# Altium integrated library mylib.IntLib: 236 symbols (part 1 of 2) (continued)
## FPC-50P (continued)

## G2R-2
designator K?
pins: A1, A2, A3, B1, B2, B3, X1, X2
text: X

## G6H
designator U?
G6HK-2
pins: 1 + (in), 2 C, 3 P, 4 O, 5 - (out), 6 - (out), 7 O, 8 P, 9 C, 10 + (in)

## GB8XS
designator P?
footprint finger
pins: 1, 2, 3, 4, 5, 6, 7, 8

## GDS
designator G?  (value not drawn)
GAS DISCHARGE TUBE
footprint LC-GDTs_SMD
footprint LC-SMD-5050_2P
pins: 1, 2

## HAL13S
designator Q?, comment 013  (value not drawn)
footprint LC-SOT-23-3
pins: 1 VCC (power), 2 GND (power), 3 Q (power)

## HC165AG
designator U?
8-Bit Parallel-Load Shift Register; Published: 8-Jun-2000; LatestRevisionDate: 13-Apr-2006; LatestRevisionNote: IPC-7351 Footprint Added.; DatasheetVersion: May-1997; PackageVersion: Jan-1998; PackageReference: D016; Publisher: Altium Limited; PackageDescription: 16-Pin Small Outline Integrated Circuit 1.27 mm Pitch; Code_IPC: SOIC127P600-16; ComponentLink1Description: Manufacturer Link; ComponentLink1URL: http://www.ti.com/; ComponentLink2Description: Datasheet; ComponentLink2URL: http://www-s.ti.com/sc/ds/sn74hc165.pdf
footprint SOIC-16
pins: 1 SH/~{LD} (in), 2 CLK (in), 3 E (in), 4 F (in), 5 G (in), 6 H (in), 7 ~{QH} (out), 8 GND (power), 9 QH (out), 10 SI (in), 11 A (in), 12 B (in), 13 C (in), 14 D (in), 15 CLK INH (in), 16 VCC (power)

## HCNR200
designator U?  (value not drawn)
footprint LC-DIP-8_K
pins: 1 A "Anode", 2 K "Cathode", 3 E "Emitter", 4 C "Collector", 5 C "Collector", 6 PD2 "Collector", 7 NC "Collector", 8 NC "Collector"

## HEAD-10L
designator P?, comment SH230R-5.08  (value not drawn)
footprint HEAD-10L-2.0 (Connector; Header; 8 Position)
pins: 1, 2, 3, 4, 5, 6, 7, 8, 9, 10

## HEAD-10P
designator P?, comment SH230R-5.08  (value not drawn)
footprint HEAD-10P-2.0
pins: 1, 2, 3, 4, 5, 6, 7, 8, 9, 10

## HEAD-18L
designator P?, comment SH230R-5.08  (value not drawn)
footprint HEAD-18L-2.0 (Connector; Header; 8 Position)
pins: 1, 2, 3, 4, 5, 6, 7, 8, 9, 10, 11, 12, 13, 14, 15, 16, 17, 18

## HEAD-18P
designator P?, comment SH230R-5.08  (value not drawn)
footprint HEAD-18P-2.0
pins: 1, 2, 3, 4, 5, 6, 7, 8, 9, 10, 11, 12, 13, 14, 15, 16, 17, 18

## Header 2
designator P?
Header, 2-Pin; LatestRevisionDate: 17-Jul-2002; LatestRevisionNote: Re-released for DXP Platform.; Publisher: Altium Limited
footprint CJ
pins: 1, 2
2 alternate drawings of the same symbol

## HH52B
designator K?
footprint HH52B
pins: A1, A2, A3, B1, B2, B3, X1, X2
text: X

## HH53B
designator K?
footprint HH53B
pins: A1, A2, A3, B1, B2, B3, C1, C2, C3, X1, X2
4 alternate drawings of the same symbol
text: X

## HH54B
designator K?
footprint HH54B
pins: A1, A2, A3, B1, B2, B3, C1, C2, C3, D1, D2, D3, X1, X2
text: X

## HT48R06A-1
designator U?
footprint DIP18
pins: 1 PA3 (in), 2 PA2 (in), 3 PA1 (in), 4 PA0 (in), 5 PB2 (in), 6 PB1/~{BZ} (in), 7 PB0/BZ (in), 8 VSS (power), 9 PC0/~{INT} (in), 10 PC1/~{TMR} (in), 11 ~{RES} (in), 12 VDD (power), 13 OSC1 (in), 14 OSC2 (in), 15 PA7 (in), 16 PA6 (in), 17 PA5 (in), 18 PA4 (in)

## HT48X05
designator U?, comment 48X0506
footprint DIP18
pins: 1 PA3 (io), 2 PA2 (io), 3 PA1 (io), 4 PA0 (io), 5 PB2 (io), 6 PB1 (io), 7 PB0 (io), 8 VSS (power), 9 PC0/INT0 (io), 10 PC1 (io), 11 RES, 12 VDD (power), 13 OSC1, 14 OSC2, 15 PA7 (io), 16 PA6 (io), 17 PA5 (io), 18 PA4 (io)

## HT1621
designator U?
footprint SSOP48
pins: 1 SEG7 (out), 2 SEG6 (out), 3 SEG5 (out), 4 SEG4 (out), 5 SEG3 (out), 6 SEG2 (out), 7 SEG1 (out), 8 SEG0 (out), 9 ~{CS}, 10 ~{RD}, 11 ~{WR}, 12 DATA, 13 GND (power), 14 OSCO (out), 15 NC (power), 16 OSCI (in), 17 VDD, 18 ~{IRQ}, 19 BZ (out), 20 ~{BZ}, 21 COM0, 22 COM1, 23 COM2, 24 COM3, 25 SEG31, 26 SEG30, 27 SEG29, 28 SEG28, 29 SEG27, 30 SEG26, 31 SEG25, 32 SEG24, 33 SEG23, 34 SEG22, 35 SEG21, 36 SEG20, 37 SEG19, 38 SEG18, 39 SEG17, 40 SEG16, 41 SEG15 (out), 42 SEG14 (out), 43 SEG13 (out), 44 SEG12 (out), 45 SEG11 (out), 46 SEG10 (out), 47 SEG9 (out), 48 SEG8 (out)

## HT1621B
designator U?
footprint HT1621-PAD
pins: 1 ~{CS}, 2 ~{RD}, 3 ~{WR}, 4 DATA, 5 GND (power), 6 OSCO (out), 7 OSCI (in), 8 VLCD, 9 VCC (power), 10 ~{IRQ}, 11 BZ (out), 12 ~{BZ}, 13 COM0, 14 COM1, 15 COM2, 16 COM3, 17 SEG31, 18 SEG30, 19 SEG29, 20 SEG28, 21 SEG27, 22 SEG26, 23 SEG25, 24 SEG24, 25 SEG23, 26 SEG22, 27 SEG21, 28 SEG20, 29 SEG19, 30 SEG18, 31 SEG17, 32 SEG16, 33 SEG15 (out), 34 SEG14 (out), 35 SEG13 (out), 36 SEG12 (out), 37 SEG11 (out), 38 SEG10 (out), 39 SEG9 (out), 40 SEG8 (out), 41 SEG7 (out), 42 SEG6 (out), 43 SEG5 (out), 44 SEG4 (out), 45 SEG3 (out), 46 SEG2 (out), 47 SEG1 (out), 48 SEG0 (out)

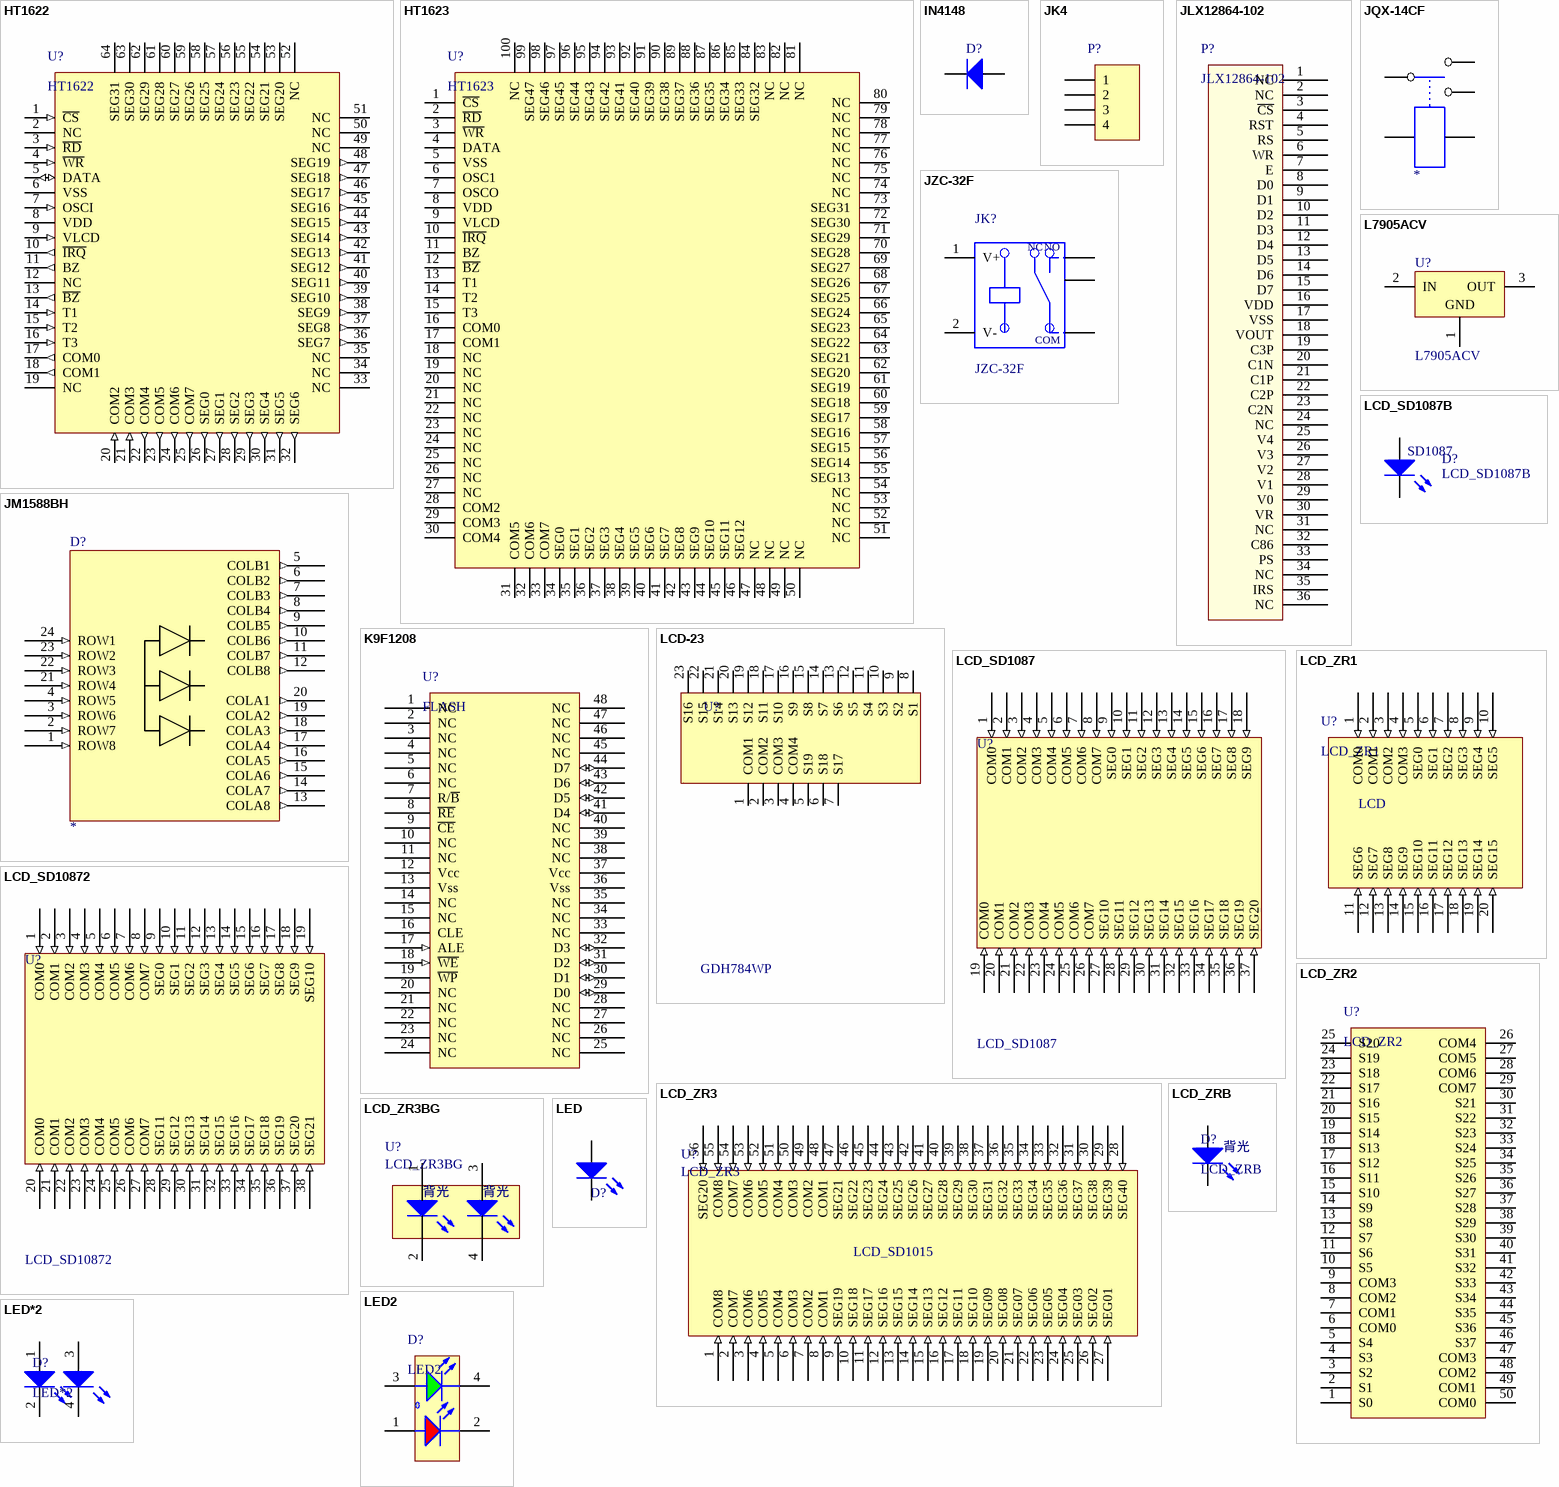
[diagram p3: symbols HT1622 to LED*2]

## HT1622
designator U?
footprint QFP64_HT1622 (HT1622)
pins: 1 ~{CS} (in), 2 NC, 3 ~{RD} (in), 4 ~{WR} (in), 5 DATA (io), 6 VSS (power), 7 OSCI (in), 8 VDD (power), 9 VLCD (in), 10 ~{IRQ} (out), 11 BZ (out), 12 NC, 13 ~{BZ} (out), 14 T1 (in), 15 T2 (in), 16 T3 (in), 17 COM0 (out), 18 COM1 (out), 19 NC, 20 COM2 (in), 21 COM3 (in), 22 COM4 (out), 23 COM5 (out), 24 COM6 (out), 25 COM7 (out), 26 SEG0 (out), 27 SEG1 (out), 28 SEG2 (out), 29 SEG3 (out), 30 SEG4 (out), 31 SEG5 (out), 32 SEG6 (out), 33 NC, 34 NC, 35 NC, 36 SEG7 (out), 37 SEG8 (out), 38 SEG9 (out), 39 SEG10 (out), 40 SEG11 (out), 41 SEG12 (out), 42 SEG13 (out), 43 SEG14 (out), 44 SEG15 (out), 45 SEG16 (out), 46 SEG17 (out), 47 SEG18 (out), 48 SEG19 (out), 49 NC, 50 NC, 51 NC, 52 NC, 53 SEG20, 54 SEG21, 55 SEG22, 56 SEG23, 57 SEG24, 58 SEG25, 59 SEG26, 60 SEG27, 61 SEG28, 62 SEG29, 63 SEG30, 64 SEG31

## HT1623
designator U?
footprint QFP100
pins: 1 ~{CS}, 2 ~{RD}, 3 ~{WR}, 4 DATA, 5 VSS, 6 OSC1, 7 OSCO, 8 VDD, 9 VLCD, 10 ~{IRQ}, 11 BZ, 12 ~{BZ}, 13 T1, 14 T2, 15 T3, 16 COM0, 17 COM1, 18 NC, 19 NC, 20 NC, 21 NC, 22 NC, 23 NC, 24 NC, 25 NC, 26 NC, 27 NC, 28 COM2, 29 COM3, 30 COM4, 31 COM5, 32 COM6, 33 COM7, 34 SEG0, 35 SEG1, 36 SEG2, 37 SEG3, 38 SEG4, 39 SEG5, 40 SEG6, 41 SEG7, 42 SEG8, 43 SEG9, 44 SEG10, 45 SEG11, 46 SEG12, 47 NC, 48 NC, 49 NC, 50 NC, 51 NC, 52 NC, 53 NC, 54 NC, 55 SEG13, 56 SEG14, 57 SEG15, 58 SEG16, 59 SEG17, 60 SEG18, 61 SEG19, 62 SEG20, 63 SEG21, 64 SEG22, 65 SEG23, 66 SEG24, 67 SEG25, 68 SEG26, 69 SEG27, 70 SEG28, 71 SEG29, 72 SEG30, 73 SEG31, 74 NC, 75 NC, 76 NC, 77 NC, 78 NC, 79 NC, 80 NC, 81 NC, 82 NC, 83 NC, 84 SEG32, 85 SEG33, 86 SEG34, 87 SEG35, 88 SEG36, 89 SEG37, 90 SEG38, 91 SEG39, 92 SEG40, 93 SEG41, 94 SEG42, 95 SEG43, 96 SEG44, 97 SEG45, 98 SEG46, 99 SEG47, 100 NC

## IN4148
designator D?  (value not drawn)
footprint LC-0603_LED_S2
pins: A 1, K 2

## JK4
designator P?  (value not drawn)
footprint JK4
pins: 1, 2, 3, 4

## JLX12864-102
designator P?
footprint JK4
pins: 1 NC, 2 NC, 3 ~{CS}, 4 RST, 5 RS, 6 WR, 7 E, 8 D0, 9 D1, 10 D2, 11 D3, 12 D4, 13 D5, 14 D6, 15 D7, 16 VDD, 17 VSS, 18 VOUT, 19 C3P, 20 C1N, 21 C1P, 22 C2P, 23 C2N, 24 NC, 25 V4, 26 V3, 27 V2, 28 V1, 29 V0, 30 VR, 31 NC, 32 C86, 33 PS, 34 NC, 35 IRS, 36 NC

## JM1588BH
designator D?
JM1588单双点阵
pins: 1 ROW8 (in), 2 ROW7 (in), 3 ROW6 (in), 4 ROW5 (in), 5 COLB1 (out), 6 COLB2 (out), 7 COLB3 (out), 8 COLB4 (out), 9 COLB5 (out), 10 COLB6 (out), 11 COLB7 (out), 12 COLB8 (out), 13 COLA8 (out), 14 COLA7 (out), 15 COLA6 (out), 16 COLA5 (out), 17 COLA4 (out), 18 COLA3 (out), 19 COLA2 (out), 20 COLA1 (out), 21 ROW4 (in), 22 ROW3 (in), 23 ROW2 (in), 24 ROW1 (in)

## JQX-14CF
designator ?
pins: 0, 1, 2, 3, 4

## JZC-32F
designator JK?
footprint JQC-3FF
pins: 1 V+ (power), 2 V- (power), COM, NC, NO (power)

## K9F1208
designator U?, comment FLASH
footprint TSOP48
pins: 1 NC, 2 NC, 3 NC, 4 NC, 5 NC, 6 NC, 7 R/~{B}, 8 ~{RE}, 9 ~{CE}, 10 NC, 11 NC, 12 Vcc (power), 13 Vss (power), 14 NC, 15 NC, 16 CLE, 17 ALE (in), 18 ~{WE} (in), 19 ~{WP}, 20 NC, 21 NC, 22 NC, 23 NC, 24 NC, 25 NC, 26 NC, 27 NC, 28 NC, 29 D0 (io), 30 D1 (io), 31 D2 (io), 32 D3 (io), 33 NC, 34 NC, 35 NC, 36 Vss (power), 37 Vcc (power), 38 NC, 39 NC, 40 NC, 41 D4 (io), 42 D5 (io), 43 D6 (io), 44 D7 (io), 45 NC, 46 NC, 47 NC, 48 NC

## L7905ACV
designator U?
Note: Tab is connected to pin 3 (IN).; Published: 24-Aug-2001; LatestRevisionDate: 17-Jul-2002; LatestRevisionNote: Re-released for DXP Platform.; DatasheetVersion: Nov-1999; PackageReference: TO220V; Publisher: Altium Limited; PackageDescription: TO, Thru-Hole, Vertical, Heatsink Mounted; 3 In-Line Leads; Pitch 2.54 mm; Pin sequence 1, 3, 2; ComponentLink1Description: Manufacturer Link; ComponentLink1URL: http://www.st.com/; ComponentLink2Description: Datasheet; ComponentLink2URL: http://www.st.com/stonline/products/literature/ds/2150/l7905ac.pdf
footprint TO-220V
pins: 1 GND (power), 2 IN (power), 3 OUT (power)

## LCD-23
designator U?, comment GDH784WP
footprint LCD-23 (GDH784WP)
pins: 1 COM1, 2 COM2, 3 COM3, 4 COM4, 5 S19, 6 S18, 7 S17, 8 S1, 9 S2, 10 S3, 11 S4, 12 S5, 13 S6, 14 S7, 15 S8, 16 S9, 17 S10, 18 S11, 19 S12, 20 S13, 21 S14, 22 S15, 23 S16
2 alternate drawings of the same symbol

## LCD_SD1087
designator U?
footprint LCD_SD1087
pins: 1 COM0 (in), 2 COM1 (in), 3 COM2 (in), 4 COM3 (in), 5 COM4 (in), 6 COM5 (in), 7 COM6 (in), 8 COM7 (in), 9 SEG0 (in), 10 SEG1 (in), 11 SEG2 (in), 12 SEG3 (in), 13 SEG4 (in), 14 SEG5 (in), 15 SEG6 (in), 16 SEG7 (in), 17 SEG8 (in), 18 SEG9 (in), 19 COM0 (in), 20 COM1 (in), 21 COM2 (in), 22 COM3 (in), 23 COM4 (in), 24 COM5 (in), 25 COM6 (in), 26 COM7 (in), 27 SEG10 (in), 28 SEG11 (in), 29 SEG12 (in), 30 SEG13 (in), 31 SEG14 (in), 32 SEG15 (in), 33 SEG16 (in), 34 SEG17 (in), 35 SEG18 (in), 36 SEG19 (in), 37 SEG20 (in)

## LCD_SD1087B
designator D?
footprint LCD_SD1087B
pins: 1, 2
text: SD1087

## LCD_SD10872
designator U?
footprint LCD_SD10872
pins: 1 COM0 (in), 2 COM1 (in), 3 COM2 (in), 4 COM3 (in), 5 COM4 (in), 6 COM5 (in), 7 COM6 (in), 8 COM7 (in), 9 SEG0 (in), 10 SEG1 (in), 11 SEG2 (in), 12 SEG3 (in), 13 SEG4 (in), 14 SEG5 (in), 15 SEG6 (in), 16 SEG7 (in), 17 SEG8 (in), 18 SEG9 (in), 19 SEG10 (in), 20 COM0 (in), 21 COM1 (in), 22 COM2 (in), 23 COM3 (in), 24 COM4 (in), 25 COM5 (in), 26 COM6 (in), 27 COM7 (in), 28 SEG11 (in), 29 SEG12 (in), 30 SEG13 (in), 31 SEG14 (in), 32 SEG15 (in), 33 SEG16 (in), 34 SEG17 (in), 35 SEG18 (in), 36 SEG19 (in), 37 SEG20 (in), 38 SEG21 (in)

## LCD_ZR1
designator U?
footprint LCD_ZR1
footprint LCD_ZR1
pins: 1 COM0 (in), 2 COM1 (in), 3 COM2 (in), 4 COM3 (in), 5 SEG0 (in), 6 SEG1 (in), 7 SEG2 (in), 8 SEG3 (in), 9 SEG4 (in), 10 SEG5 (in), 11 SEG6 (in), 12 SEG7 (in), 13 SEG8 (in), 14 SEG9 (in), 15 SEG10 (in), 16 SEG11 (in), 17 SEG12 (in), 18 SEG13 (in), 19 SEG14 (in), 20 SEG15 (in)
text: LCD

## LCD_ZR2
designator U?
pins: 1 S0, 2 S1, 3 S2, 4 S3, 5 S4, 6 COM0, 7 COM1, 8 COM2, 9 COM3, 10 S5, 11 S6, 12 S7, 13 S8, 14 S9, 15 S10, 16 S11, 17 S12, 18 S13, 19 S14, 20 S15, 21 S16, 22 S17, 23 S18, 24 S19, 25 S20, 26 COM4, 27 COM5, 28 COM6, 29 COM7, 30 S21, 31 S22, 32 S23, 33 S24, 34 S25, 35 S26, 36 S27, 37 S28, 38 S29, 39 S30, 40 S31, 41 S32, 42 S33, 43 S34, 44 S35, 45 S36, 46 S37, 47 COM3, 48 COM2, 49 COM1, 50 COM0

## LCD_ZR3
designator U?
footprint LCD_ZR3
pins: 1 COM8 (in), 2 COM7 (in), 3 COM6 (in), 4 COM5 (in), 5 COM4 (in), 6 COM3 (in), 7 COM2 (in), 8 COM1 (in), 9 SEG19 (in), 10 SEG18 (in), 11 SEG17 (in), 12 SEG16 (in), 13 SEG15 (in), 14 SEG14 (in), 15 SEG13 (in), 16 SEG12 (in), 17 SEG11 (in), 18 SEG10 (in), 19 SEG09 (in), 20 SEG08 (in), 21 SEG07 (in), 22 SEG06 (in), 23 SEG05 (in), 24 SEG04 (in), 25 SEG03 (in), 26 SEG02 (in), 27 SEG01 (in), 28 SEG40 (in), 29 SEG39 (in), 30 SEG38 (in), 31 SEG37 (in), 32 SEG36 (in), 33 SEG35 (in), 34 SEG34 (in), 35 SEG33 (in), 36 SEG32 (in), 37 SEG31 (in), 38 SEG30 (in), 39 SEG29 (in), 40 SEG28 (in), 41 SEG27 (in), 42 SEG26 (in), 43 SEG25 (in), 44 SEG24 (in), 45 SEG23 (in), 46 SEG22 (in), 47 SEG21 (in), 48 COM1 (in), 49 COM2 (in), 50 COM3 (in), 51 COM4 (in), 52 COM5 (in), 53 COM6 (in), 54 COM7 (in), 55 COM8 (in), 56 SEG20 (in)
text: LCD_SD1015

## LCD_ZR3BG
designator U?
footprint LCD_ZR3BG
pins: 1, 2, 3, 4
text: 背光

## LCD_ZRB
designator D?
footprint LCD_ZRB
pins: 1, 2
text: 背光

## LED
designator D?  (value not drawn)
footprint LC-0805_LED
pins: A 1, K 2

## LED2
designator D?
footprint LED*2A
pins: 1, 2, 3, 4

## LED*2
designator D?
footprint D_LED*2
footprint LED*2
pins: 1, 2, 3, 4

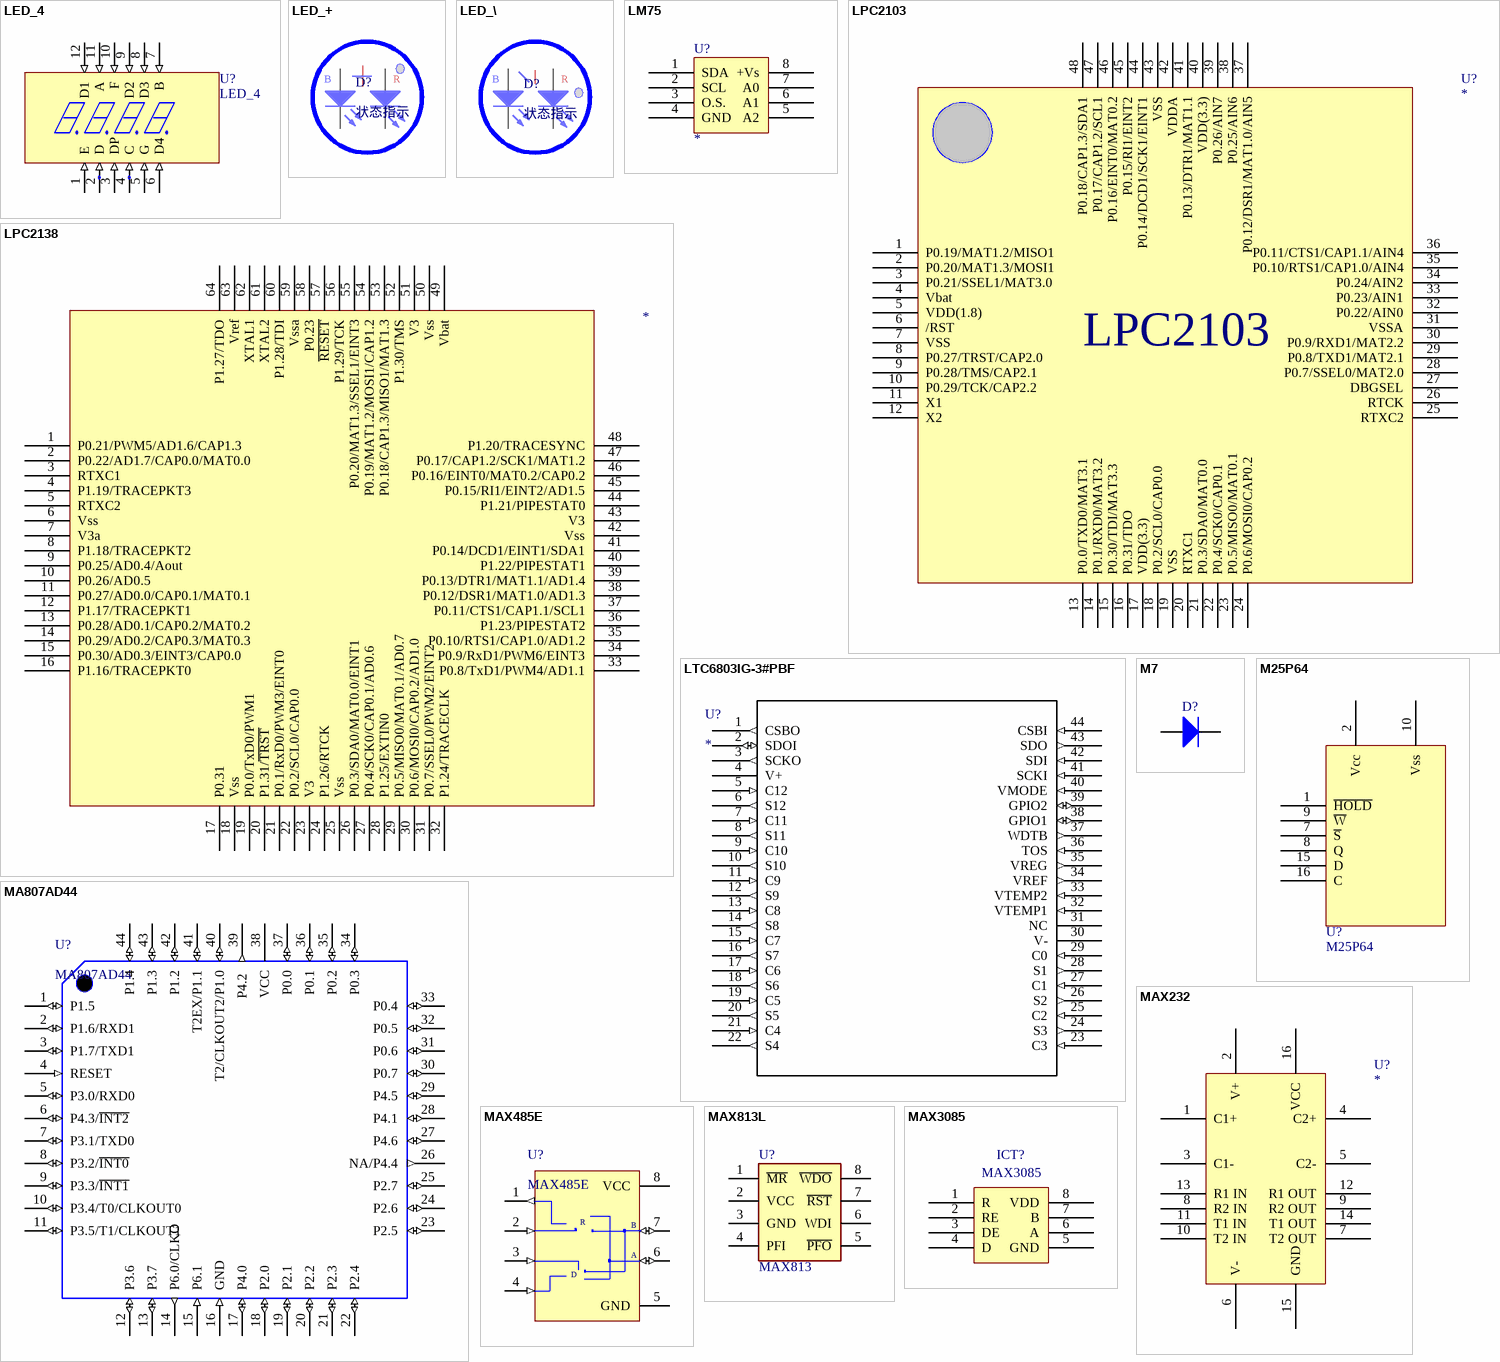
[diagram p4: symbols LED_4 to MAX3085]

## LED_4
designator U?
footprint LED_4X
footprint LED_4D
pins: 1 E (in), 2 D (in), 3 DP (in), 4 C (in), 5 G (in), 6 D4 (in), 7 B (in), 8 D3 (in), 9 D2 (in), 10 F (in), 11 A (in), 12 D1 (in)

## LED_+
designator D?, comment 状态指示
footprint LED_+
footprint LED_+
pins: 1, 2, 3, 4
text: B; R

## LED_\
designator D?, comment 状态指示
footprint LED_\
pins: 1, 2, 3, 4
text: B; R

## LM75
designator U?
footprint SO-8
pins: 1 SDA, 2 SCL, 3 O.S., 4 GND, 5 A2, 6 A1, 7 A0, 8 +Vs

## LPC2103
designator U?
pins: 1 P0.19/MAT1.2/MISO1, 2 P0.20/MAT1.3/MOSI1, 3 P0.21/SSEL1/MAT3.0, 4 Vbat, 5 VDD(1.8), 6 /RST, 7 VSS, 8 P0.27/TRST/CAP2.0, 9 P0.28/TMS/CAP2.1, 10 P0.29/TCK/CAP2.2, 11 X1, 12 X2, 13 P0.0/TXD0/MAT3.1, 14 P0.1/RXD0/MAT3.2, 15 P0.30/TDI/MAT3.3, 16 P0.31/TDO, 17 VDD(3.3), 18 P0.2/SCL0/CAP0.0, 19 VSS, 20 RTXC1, 21 P0.3/SDA0/MAT0.0, 22 P0.4/SCK0/CAP0.1, 23 P0.5/MISO0/MAT0.1, 24 P0.6/MOSI0/CAP0.2, 25 RTXC2, 26 RTCK, 27 DBGSEL, 28 P0.7/SSEL0/MAT2.0, 29 P0.8/TXD1/MAT2.1, 30 P0.9/RXD1/MAT2.2, 31 VSSA, 32 P0.22/AIN0, 33 P0.23/AIN1, 34 P0.24/AIN2, 35 P0.10/RTS1/CAP1.0/AIN4, 36 P0.11/CTS1/CAP1.1/AIN4, 37 P0.12/DSR1/MAT1.0/AIN5, 38 P0.25/AIN6, 39 P0.26/AIN7, 40 VDD(3.3), 41 P0.13/DTR1/MAT1.1, 42 VDDA, 43 VSS, 44 P0.14/DCD1/SCK1/EINT1, 45 P0.15/RI1/EINT2, 46 P0.16/EINT0/MAT0.2, 47 P0.17/CAP1.2/SCL1, 48 P0.18/CAP1.3/SDA1

## LPC2138
designator ?
pins: 1 P0.21/PWM5/AD1.6/CAP1.3, 2 P0.22/AD1.7/CAP0.0/MAT0.0, 3 RTXC1, 4 P1.19/TRACEPKT3, 5 RTXC2, 6 Vss, 7 V3a, 8 P1.18/TRACEPKT2, 9 P0.25/AD0.4/Aout, 10 P0.26/AD0.5, 11 P0.27/AD0.0/CAP0.1/MAT0.1, 12 P1.17/TRACEPKT1, 13 P0.28/AD0.1/CAP0.2/MAT0.2, 14 P0.29/AD0.2/CAP0.3/MAT0.3, 15 P0.30/AD0.3/EINT3/CAP0.0, 16 P1.16/TRACEPKT0, 17 P0.31, 18 Vss, 19 P0.0/TxD0/PWM1, 20 P1.31/~{TRST}, 21 P0.1/RxD0/PWM3/EINT0, 22 P0.2/SCL0/CAP0.0, 23 V3, 24 P1.26/RTCK, 25 Vss, 26 P0.3/SDA0/MAT0.0/EINT1, 27 P0.4/SCK0/CAP0.1/AD0.6, 28 P1.25/EXTIN0, 29 P0.5/MISO0/MAT0.1/AD0.7, 30 P0.6/MOSI0/CAP0.2/AD1.0, 31 P0.7/SSEL0/PWM2/EINT2, 32 P1.24/TRACECLK, 33 P0.8/TxD1/PWM4/AD1.1, 34 P0.9/RxD1/PWM6/EINT3, 35 P0.10/RTS1/CAP1.0/AD1.2, 36 P1.23/PIPESTAT2, 37 P0.11/CTS1/CAP1.1/SCL1, 38 P0.12/DSR1/MAT1.0/AD1.3, 39 P0.13/DTR1/MAT1.1/AD1.4, 40 P1.22/PIPESTAT1, 41 P0.14/DCD1/EINT1/SDA1, 42 Vss, 43 V3, 44 P1.21/PIPESTAT0, 45 P0.15/RI1/EINT2/AD1.5, 46 P0.16/EINT0/MAT0.2/CAP0.2, 47 P0.17/CAP1.2/SCK1/MAT1.2, 48 P1.20/TRACESYNC, 49 Vbat, 50 Vss, 51 V3, 52 P1.30/TMS, 53 P0.18/CAP1.3/MISO1/MAT1.3, 54 P0.19/MAT1.2/MOSI1/CAP1.2, 55 P0.20/MAT1.3/SSEL1/EINT3, 56 P1.29/TCK, 57 ~{RESET}, 58 P0.23, 59 Vssa, 60 P1.28/TDI, 61 XTAL2, 62 XTAL1, 63 Vref, 64 P1.27/TDO

## LTC6803IG-3#PBF
designator U?
Imported; Manufacturer_Part_Number: ltc6803ig-3#pbf; Vendor: Linear Technology; RefDes: RefDes; Type: DEV; Value: Value
footprint SSOP-44_G
pins: 1 CSBO (out), 2 SDOI (io), 3 SCKO (out), 4 V+ (power), 5 C12 (in), 6 S12 (out), 7 C11 (in), 8 S11 (out), 9 C10 (in), 10 S10 (out), 11 C9 (in), 12 S9 (out), 13 C8 (in), 14 S8 (out), 15 C7 (in), 16 S7 (out), 17 C6 (in), 18 S6 (out), 19 C5 (in), 20 S5 (out), 21 C4 (in), 22 S4 (out), 23 C3 (in), 24 S3 (out), 25 C2 (in), 26 S2 (out), 27 C1 (in), 28 S1 (out), 29 C0 (in), 30 V- (power), 31 NC, 32 VTEMP1 (in), 33 VTEMP2 (in), 34 VREF (out), 35 VREG (out), 36 TOS (in), 37 WDTB (out), 38 GPIO1 (io), 39 GPIO2 (io), 40 VMODE (in), 41 SCKI (in), 42 SDI (in), 43 SDO (out), 44 CSBI (in)

## M7
designator D?  (value not drawn)
footprint 1206D
pins: 1, 2

## M25P64
designator U?
footprint SO-16 (Footprint not found)
pins: 1 ~{HOLD}, 2 Vcc (power), 3 DU (power) hidden, 4 DU (power) hidden, 5 DU (power) hidden, 6 DU (power) hidden, 7 ~{S} (power), 8 Q (power), 9 ~{W} (power), 10 Vss (power), 11 DU (power) hidden, 12 DU (power) hidden, 13 DU (power) hidden, 14 DU (power) hidden, 15 D (power), 16 C (power)

## MA807AD44
designator U?
footprint LQFP-44
pins: 1 P1.5 (io), 2 P1.6/RXD1 (io), 3 P1.7/TXD1 (io), 4 RESET (in), 5 P3.0/RXD0 (io), 6 P4.3/~{INT2} (io), 7 P3.1/TXD0 (io), 8 P3.2/~{INT0} (io), 9 P3.3/~{INT1} (io), 10 P3.4/T0/CLKOUT0 (io), 11 P3.5/T1/CLKOUT1 (io), 12 P3.6  (io), 13 P3.7  (io), 14 P6.0/CLKO  (out), 15 P6.1 (in), 16 GND (in), 17 P4.0 (io), 18 P2.0  (io), 19 P2.1  (io), 20 P2.2 (io), 21 P2.3  (io), 22 P2.4  (io), 23 P2.5 (io), 24 P2.6 (io), 25 P2.7 (io), 26 NA/P4.4 (out), 27 P4.6 (io), 28 P4.1 (io), 29 P4.5 (io), 30 P0.7 (io), 31 P0.6 (io), 32 P0.5 (io), 33 P0.4 (io), 34 P0.3 (io), 35 P0.2 (io), 36 P0.1 (io), 37 P0.0 (io), 38 VCC (power), 39 P4.2  (out), 40 T2/CLKOUT2/P1.0 (io), 41 T2EX/P1.1 (io), 42 P1.2 (io), 43 P1.3 (io), 44 P1.4 (io)

## MAX232
designator U?
pins: 1 C1+, 2 V+, 3 C1-, 4 C2+, 5 C2-, 6 V-, 7 T2 OUT, 8 R2 IN, 9 R2 OUT, 10 T2 IN, 11 T1 IN, 12 R1 OUT, 13 R1 IN, 14 T1 OUT, 15 GND (power), 16 VCC (power)

## MAX485E
designator U?
footprint SO8
pins: 1 RO (out), 2 ~{RE} (in), 3 DE (in), 4 DI (in), 5 GND (power), 6 A (io), 7 B (io), 8 VCC (power)
text: R; D

## MAX813L
designator U?, comment MAX813
pins: 1 ~{MR}, 2 VCC, 3 GND, 4 PFI, 5 ~{PFO}, 6 WDI, 7 ~{RST}, 8 ~{WDO}
1 alternate drawing of the same symbol

## MAX3085
designator ICT?
footprint SO-8
pins: 1 R, 2 RE, 3 DE, 4 D, 5 GND, 6 A, 7 B, 8 VDD
2 alternate drawings of the same symbol

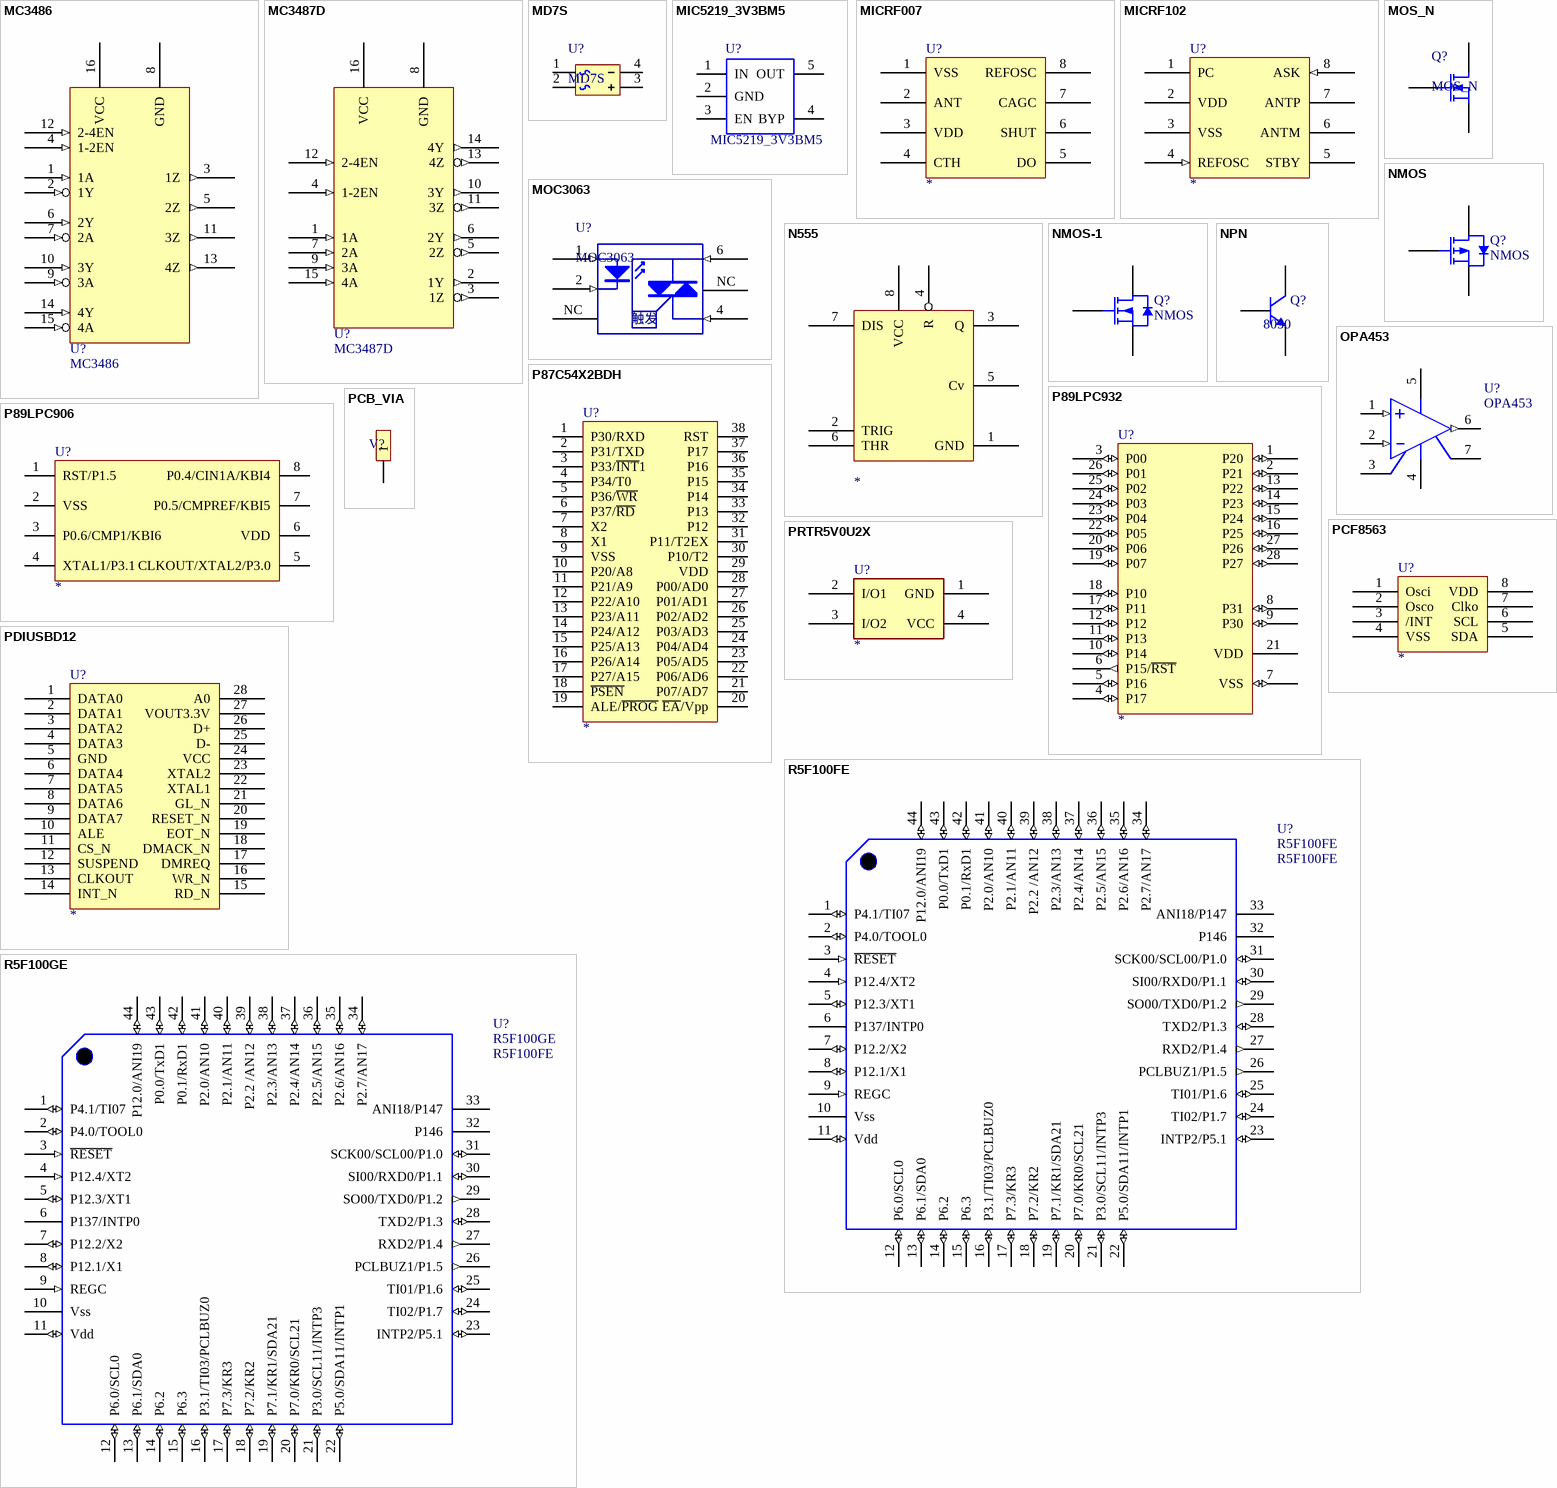
[diagram p5: symbols MC3486 to R5F100GE]

## MC3486
designator U?
footprint SO-16 (Footprint not found)
pins: 1 1A (in), 2 1Y (in), 3 1Z (out), 4 1-2EN (in), 5 2Z (out), 6 2Y (in), 7 2A (in), 8 GND (power), 9 3A (in), 10 3Y (in), 11 3Z (out), 12 2-4EN (in), 13 4Z (out), 14 4Y (in), 15 4A (in), 16 VCC (power)

## MC3487D
designator U?
footprint SO-16 (Footprint not found)
pins: 1 1A (in), 2 1Y (out), 3 1Z (out), 4 1-2EN (in), 5 2Z (out), 6 2Y (out), 7 2A (in), 8 GND (power), 9 3A (in), 10 3Y (out), 11 3Z (out), 12 2-4EN (in), 13 4Z (out), 14 4Y (out), 15 4A (in), 16 VCC (power)

## MD7S
designator U?
footprint MD7S (SOP, 4-Leads, Body 4.9x4.0mm (max), Pitch 2.74mm, IPC Low Density)
pins: 1, 2, 3, 4

## MIC5219_3V3BM5
designator U?
footprint SOT23-5L
pins: 1 IN, 2 GND, 3 EN, 4 BYP, 5 OUT

## MICRF007
designator U?
pins: 1 VSS (power), 2 ANT, 3 VDD (power), 4 CTH, 5 DO, 6 SHUT, 7 CAGC, 8 REFOSC

## MICRF102
designator U?
pins: 1 PC, 2 VDD, 3 VSS (power), 4 REFOSC (in), 5 STBY, 6 ANTM, 7 ANTP, 8 ASK (in)

## MOC3063
designator U?
footprint OPT_6
pins: 1 ANODE (in), 2 CATHODE (in), 4 MAIN TERM (in), 6 MAIN TERM (in), NC 3, NC 5
text: 触发

## MOS_N
designator Q?
footprint TO229 (D-PAK, 3-Pads, Body 6.2x6.7mm (max), IPC Low Density)
pins: 1 G, 3 S, 4 D

## N555
designator ?
pins: 1 GND (power), 2 TRIG, 3 Q, 4 R, 5 Cv, 6 THR, 7 DIS, 8 VCC (power)
